# Altium schematic symbol library Regulator_Linear.SchLib: 1452 symbols (part 4 of 10)
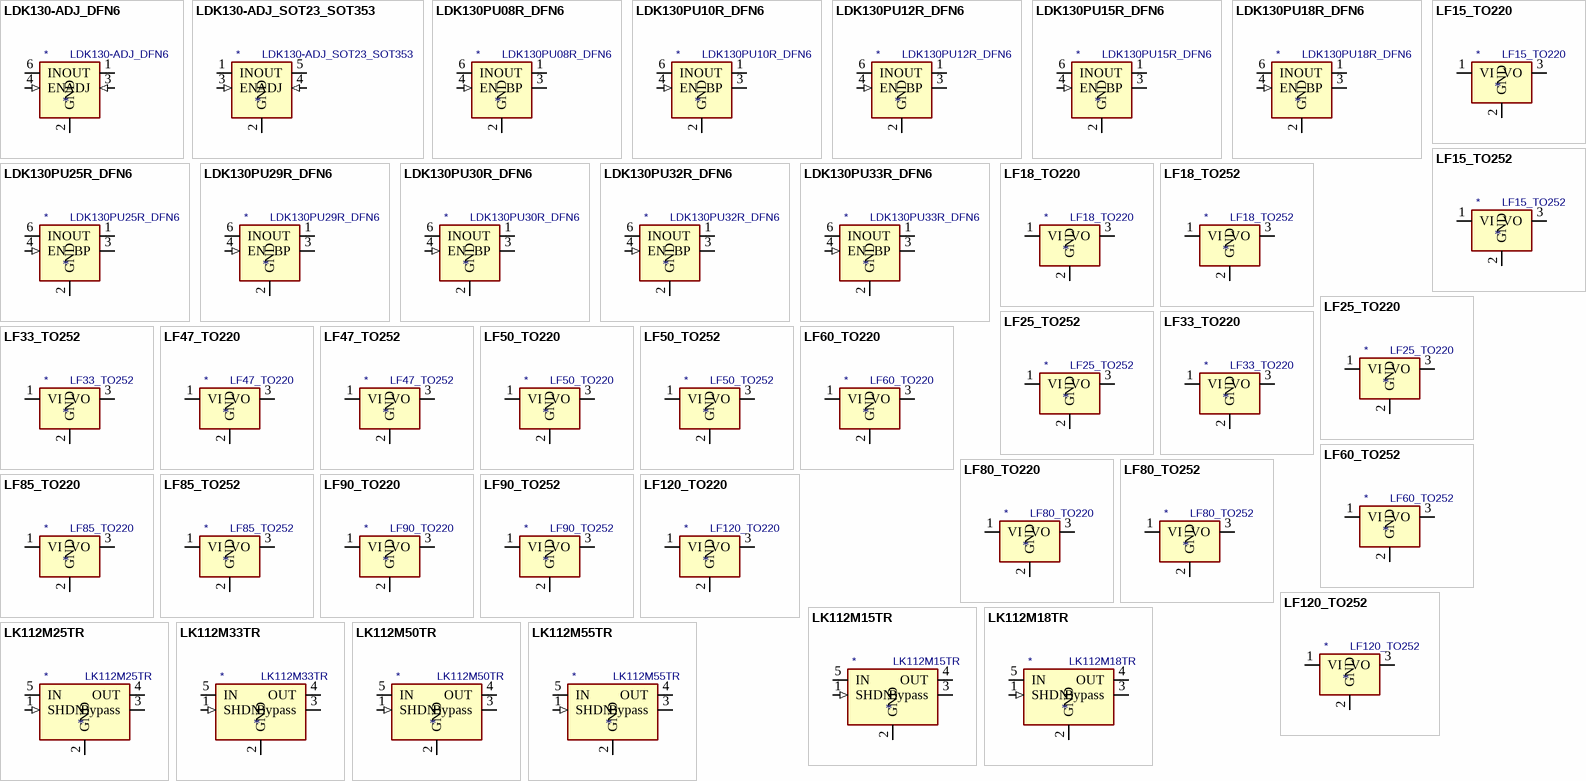
[diagram p39: symbols LDK130-ADJ_DFN6 to LK112M55TR]

## LF85_TO220
designator *  value LF85_TO220
ki_keywords: LDO regulator voltage; ki_description: Low-drop Voltage Regulator, Io up to 500mA, Fixed Vo 8.5V, TO-220; ki_fp_filters: TO?220*; Footprint: Package_TO_SOT_THT:TO-220-3_Vertical; Supplier: http://www.st.com/content/ccc/resource/technical/document/datasheet/c4/0e/7e/2a/be/bc/4c/bd/CD00000546.pdf/files/CD00000546.pdf/jcr:content/translations/en.CD00000546.pdf
footprint TO-220-3_Vertical
pins: 1 VI (power), 2 GND (power), 3 VO (power)

## LF85_TO252
designator *  value LF85_TO252
ki_keywords: LDO regulator voltage; ki_description: Low-drop Voltage Regulator, Io up to 500mA, Fixed Vo 8.5V, TO-252 (DPAK); ki_fp_filters: TO?252*; Footprint: Package_TO_SOT_SMD:TO-252-2; Supplier: http://www.st.com/content/ccc/resource/technical/document/datasheet/c4/0e/7e/2a/be/bc/4c/bd/CD00000546.pdf/files/CD00000546.pdf/jcr:content/translations/en.CD00000546.pdf
footprint TO-252-2
pins: 1 VI (power), 2 GND (power), 3 VO (power)

## LF90_TO220
designator *  value LF90_TO220
ki_keywords: LDO regulator voltage; ki_description: Low-drop Voltage Regulator, Io up to 500mA, Fixed Vo 9.0V, TO-220; ki_fp_filters: TO?220*; Footprint: Package_TO_SOT_THT:TO-220-3_Vertical; Supplier: http://www.st.com/content/ccc/resource/technical/document/datasheet/c4/0e/7e/2a/be/bc/4c/bd/CD00000546.pdf/files/CD00000546.pdf/jcr:content/translations/en.CD00000546.pdf
footprint TO-220-3_Vertical
pins: 1 VI (power), 2 GND (power), 3 VO (power)

## LF90_TO252
designator *  value LF90_TO252
ki_keywords: LDO regulator voltage; ki_description: Low-drop Voltage Regulator, Io up to 500mA, Fixed Vo 9.0V, TO-252 (DPAK); ki_fp_filters: TO?252*; Footprint: Package_TO_SOT_SMD:TO-252-2; Supplier: http://www.st.com/content/ccc/resource/technical/document/datasheet/c4/0e/7e/2a/be/bc/4c/bd/CD00000546.pdf/files/CD00000546.pdf/jcr:content/translations/en.CD00000546.pdf
footprint TO-252-2
pins: 1 VI (power), 2 GND (power), 3 VO (power)

## LF120_TO220
designator *  value LF120_TO220
ki_keywords: LDO regulator voltage; ki_description: Low-drop Voltage Regulator, Io up to 500mA, Fixed Vo 12.0V, TO-220; ki_fp_filters: TO?220*; Footprint: Package_TO_SOT_THT:TO-220-3_Vertical; Supplier: http://www.st.com/content/ccc/resource/technical/document/datasheet/c4/0e/7e/2a/be/bc/4c/bd/CD00000546.pdf/files/CD00000546.pdf/jcr:content/translations/en.CD00000546.pdf
footprint TO-220-3_Vertical
pins: 1 VI (power), 2 GND (power), 3 VO (power)

## LF120_TO252
designator *  value LF120_TO252
ki_keywords: LDO regulator voltage; ki_description: Low-drop Voltage Regulator, Io up to 500mA, Fixed Vo 12.0V, TO-252 (DPAK); ki_fp_filters: TO?252*; Footprint: Package_TO_SOT_SMD:TO-252-2; Supplier: http://www.st.com/content/ccc/resource/technical/document/datasheet/c4/0e/7e/2a/be/bc/4c/bd/CD00000546.pdf/files/CD00000546.pdf/jcr:content/translations/en.CD00000546.pdf
footprint TO-252-2
pins: 1 VI (power), 2 GND (power), 3 VO (power)

## LK112M15TR
designator *  value LK112M15TR
ki_keywords: LDO regulator voltage; ki_description: Low noise and low drop voltage regulator with shutdown function, 150mA, Vout = 1.5V, SOT-23-5; ki_fp_filters: SOT?23*; Footprint: Package_TO_SOT_SMD:SOT-23-5; Supplier: https://www.st.com/resource/ja/datasheet/lk112.pdf
footprint SOT-23-5
pins: 1 SHDN (in), 2 GND (power), 3 Bypass, 4 OUT (power), 5 IN (power)

## LK112M18TR
designator *  value LK112M18TR
ki_keywords: LDO regulator voltage; ki_description: Low noise and low drop voltage regulator with shutdown function, 150mA, Vout = 1.8V, SOT-23-5; ki_fp_filters: SOT?23*; Footprint: Package_TO_SOT_SMD:SOT-23-5; Supplier: https://www.st.com/resource/ja/datasheet/lk112.pdf
footprint SOT-23-5
pins: 1 SHDN (in), 2 GND (power), 3 Bypass, 4 OUT (power), 5 IN (power)

## LK112M25TR
designator *  value LK112M25TR
ki_keywords: LDO regulator voltage; ki_description: Low noise and low drop voltage regulator with shutdown function, 150mA, Vout = 2.5V, SOT-23-5; ki_fp_filters: SOT?23*; Footprint: Package_TO_SOT_SMD:SOT-23-5; Supplier: https://www.st.com/resource/ja/datasheet/lk112.pdf
footprint SOT-23-5
pins: 1 SHDN (in), 2 GND (power), 3 Bypass, 4 OUT (power), 5 IN (power)

## LK112M33TR
designator *  value LK112M33TR
ki_keywords: LDO regulator voltage; ki_description: Low noise and low drop voltage regulator with shutdown function, 150mA, Vout = 3.3V, SOT-23-5; ki_fp_filters: SOT?23*; Footprint: Package_TO_SOT_SMD:SOT-23-5; Supplier: https://www.st.com/resource/ja/datasheet/lk112.pdf
footprint SOT-23-5
pins: 1 SHDN (in), 2 GND (power), 3 Bypass, 4 OUT (power), 5 IN (power)

## LK112M50TR
designator *  value LK112M50TR
ki_keywords: LDO regulator voltage; ki_description: Low noise and low drop voltage regulator with shutdown function, 150mA, Vout = 5.0V, SOT-23-5; ki_fp_filters: SOT?23*; Footprint: Package_TO_SOT_SMD:SOT-23-5; Supplier: https://www.st.com/resource/ja/datasheet/lk112.pdf
footprint SOT-23-5
pins: 1 SHDN (in), 2 GND (power), 3 Bypass, 4 OUT (power), 5 IN (power)

## LK112M55TR
designator *  value LK112M55TR
ki_keywords: LDO regulator voltage; ki_description: Low noise and low drop voltage regulator with shutdown function, 150mA, Vout = 5.5V, SOT-23-5; ki_fp_filters: SOT?23*; Footprint: Package_TO_SOT_SMD:SOT-23-5; Supplier: https://www.st.com/resource/ja/datasheet/lk112.pdf
footprint SOT-23-5
pins: 1 SHDN (in), 2 GND (power), 3 Bypass, 4 OUT (power), 5 IN (power)

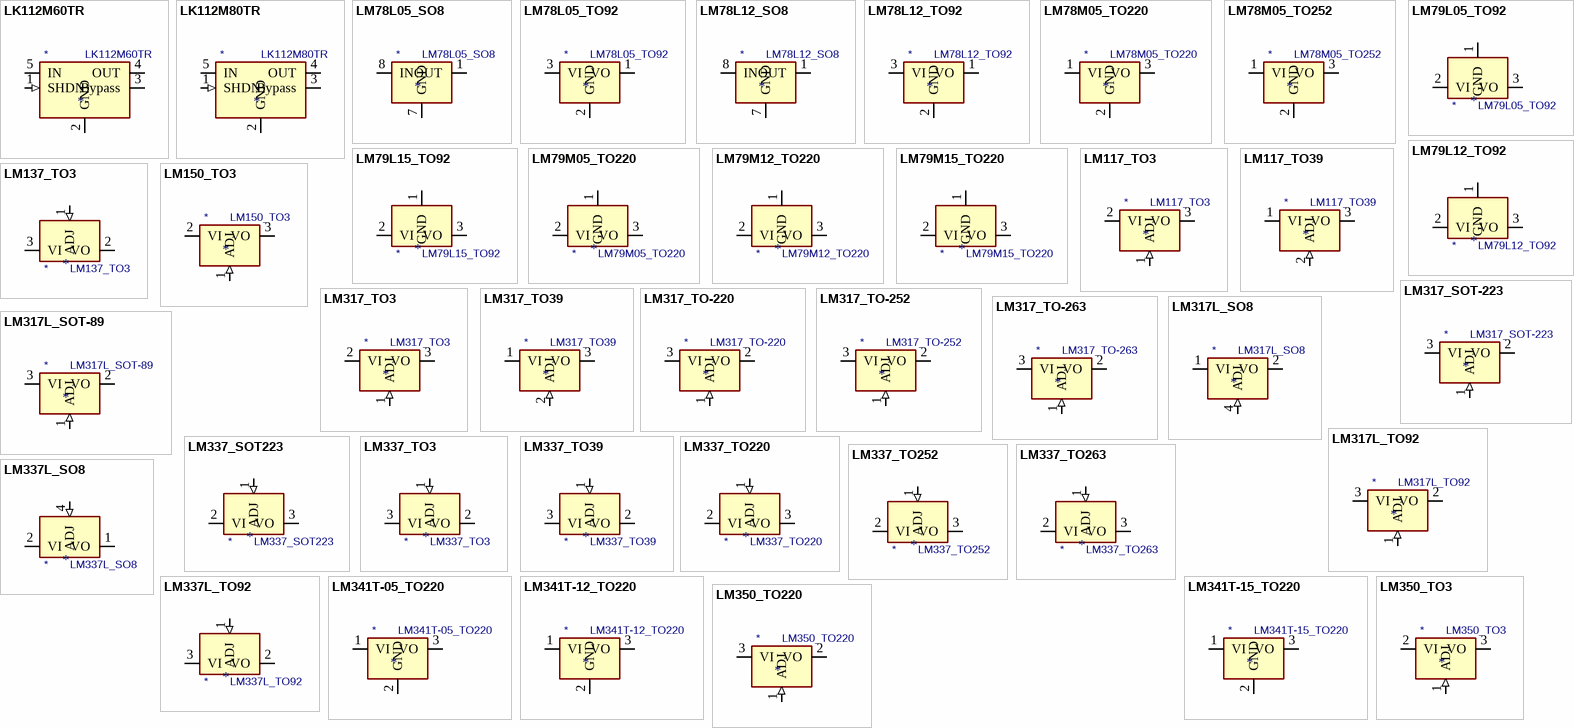
[diagram p12: symbols LK112M60TR to LM350_TO220]

## LK112M60TR
designator *  value LK112M60TR
ki_keywords: LDO regulator voltage; ki_description: Low noise and low drop voltage regulator with shutdown function, 150mA, Vout = 6.0V, SOT-23-5; ki_fp_filters: SOT?23*; Footprint: Package_TO_SOT_SMD:SOT-23-5; Supplier: https://www.st.com/resource/ja/datasheet/lk112.pdf
footprint SOT-23-5
pins: 1 SHDN (in), 2 GND (power), 3 Bypass, 4 OUT (power), 5 IN (power)

## LK112M80TR
designator *  value LK112M80TR
ki_keywords: LDO regulator voltage; ki_description: Low noise and low drop voltage regulator with shutdown function, 150mA, Vout = 8.0V, SOT-23-5; ki_fp_filters: SOT?23*; Footprint: Package_TO_SOT_SMD:SOT-23-5; Supplier: https://www.st.com/resource/ja/datasheet/lk112.pdf
footprint SOT-23-5
pins: 1 SHDN (in), 2 GND (power), 3 Bypass, 4 OUT (power), 5 IN (power)

## LM78L05_SO8
designator *  value LM78L05_SO8
ki_keywords: Voltage Regulator 100mA Positive; ki_description: Positive 100mA 30V Linear Regulator, Fixed Output 5V, SO-8; ki_fp_filters: SOIC*3.9x4.9mm*P1.27mm*; Footprint: Package_SO:SOIC-8_3.9x4.9mm_P1.27mm; Supplier: https://www.onsemi.com/pub/Collateral/MC78L06A-D.pdf
footprint SOIC-8_3.9x4.9mm_P1.27mm
pins: 1 OUT (power), 2 GND hidden, 3 GND hidden, 4 NC (in) hidden, 5 NC (in) hidden, 6 GND hidden, 7 GND (power), 8 IN (power)

## LM78L05_TO92
designator *  value LM78L05_TO92
ki_keywords: Voltage Regulator 100mA Positive; ki_description: Positive 100mA 30V Linear Regulator, Fixed Output 5V, TO-92; ki_fp_filters: TO?92*; Footprint: Package_TO_SOT_THT:TO-92_Inline; Supplier: https://www.onsemi.com/pub/Collateral/MC78L06A-D.pdf
footprint TO-92_Inline
pins: 1 VO (power), 2 GND (power), 3 VI (power)

## LM78L12_SO8
designator *  value LM78L12_SO8
ki_keywords: Voltage Regulator 100mA Positive; ki_description: Positive 100mA 30V Linear Regulator, Fixed Output 12V, SO-8; ki_fp_filters: SOIC*3.9x4.9mm*P1.27mm*; Footprint: Package_SO:SOIC-8_3.9x4.9mm_P1.27mm; Supplier: https://www.onsemi.com/pub/Collateral/MC78L06A-D.pdf
footprint SOIC-8_3.9x4.9mm_P1.27mm
pins: 1 OUT (power), 2 GND hidden, 3 GND hidden, 4 NC (in) hidden, 5 NC (in) hidden, 6 GND hidden, 7 GND (power), 8 IN (power)

## LM78L12_TO92
designator *  value LM78L12_TO92
ki_keywords: Voltage Regulator 100mA Positive; ki_description: Positive 100mA 30V Linear Regulator, Fixed Output 12V, TO-92; ki_fp_filters: TO?92*; Footprint: Package_TO_SOT_THT:TO-92_Inline; Supplier: https://www.onsemi.com/pub/Collateral/MC78L06A-D.pdf
footprint TO-92_Inline
pins: 1 VO (power), 2 GND (power), 3 VI (power)

## LM78M05_TO220
designator *  value LM78M05_TO220
ki_keywords: Voltage Regulator 500mA Positive; ki_description: Positive 500mA 35V Linear Regulator, Fixed Output 5V, TO-220; ki_fp_filters: TO?220*; Footprint: Package_TO_SOT_THT:TO-220-3_Vertical; Supplier: https://www.onsemi.com/pub/Collateral/MC78M00-D.PDF
footprint TO-220-3_Vertical
pins: 1 VI (power), 2 GND (power), 3 VO (power)

## LM78M05_TO252
designator *  value LM78M05_TO252
ki_keywords: Voltage Regulator 500mA Positive; ki_description: Positive 500mA 35V Linear Regulator, Fixed Output 5V, TO-252 (D-PAK); ki_fp_filters: TO?252*; Footprint: Package_TO_SOT_SMD:TO-252-2; Supplier: https://www.onsemi.com/pub/Collateral/MC78M00-D.PDF
footprint TO-252-2
pins: 1 VI (power), 2 GND (power), 3 VO (power)

## LM79L05_TO92
designator *  value LM79L05_TO92
ki_keywords: negative regulatpr; ki_description: 3-Terminal Negative Regulator, -5V, TO-92; ki_fp_filters: TO?92*; Footprint: Package_TO_SOT_THT:TO-92_Inline; Supplier: http://www.ti.com/lit/ds/symlink/lm79l.pdf
footprint TO-92_Inline
pins: 1 GND (power), 2 VI (power), 3 VO (power)

## LM79L12_TO92
designator *  value LM79L12_TO92
ki_keywords: negative regulatpr; ki_description: 3-Terminal Negative Regulator, -12V, TO-92; ki_fp_filters: TO?92*; Footprint: Package_TO_SOT_THT:TO-92_Inline; Supplier: http://www.ti.com/lit/ds/symlink/lm79l.pdf
footprint TO-92_Inline
pins: 1 GND (power), 2 VI (power), 3 VO (power)

## LM79L15_TO92
designator *  value LM79L15_TO92
ki_keywords: negative regulatpr; ki_description: 3-Terminal Negative Regulator, -15V, TO-92; ki_fp_filters: TO?92*; Footprint: Package_TO_SOT_THT:TO-92_Inline; Supplier: http://www.ti.com/lit/ds/symlink/lm79l.pdf
footprint TO-92_Inline
pins: 1 GND (power), 2 VI (power), 3 VO (power)

## LM79M05_TO220
designator *  value LM79M05_TO220
ki_keywords: Voltage Regulator 500mA Negative; ki_description: Negative 500mA 35V Linear Regulator, Fixed Output 5V, TO-220; ki_fp_filters: TO?220*; Footprint: Package_TO_SOT_THT:TO-220-3_Vertical; Supplier: https://www.onsemi.com/pub/Collateral/MC79M00-D.PDF
footprint TO-220-3_Vertical
pins: 1 GND (power), 2 VI (power), 3 VO (power)

## LM79M12_TO220
designator *  value LM79M12_TO220
ki_keywords: Voltage Regulator 500mA Negative; ki_description: Negative 500mA 35V Linear Regulator, Fixed Output 12V, TO-220; ki_fp_filters: TO?220*; Footprint: Package_TO_SOT_THT:TO-220-3_Vertical; Supplier: https://www.onsemi.com/pub/Collateral/MC79M00-D.PDF
footprint TO-220-3_Vertical
pins: 1 GND (power), 2 VI (power), 3 VO (power)

## LM79M15_TO220
designator *  value LM79M15_TO220
ki_keywords: Voltage Regulator 500mA Negative; ki_description: Negative 500mA 35V Linear Regulator, Fixed Output 15V, TO-220; ki_fp_filters: TO?220*; Footprint: Package_TO_SOT_THT:TO-220-3_Vertical; Supplier: https://www.onsemi.com/pub/Collateral/MC79M00-D.PDF
footprint TO-220-3_Vertical
pins: 1 GND (power), 2 VI (power), 3 VO (power)

## LM117_TO3
designator *  value LM117_TO3
ki_keywords: Adjustable Voltage Regulator 1,5A Positive; ki_description: 1,5A 35V Adjustable Linear Regulator, TO-3; ki_fp_filters: TO?3*; Footprint: Package_TO_SOT_THT:TO-3; Supplier: http://www.ti.com/lit/ds/symlink/lm317.pdf
footprint TO-3
pins: 1 ADJ (in), 2 VI (power), 3 VO (power)

## LM117_TO39
designator *  value LM117_TO39
ki_keywords: Adjustable Voltage Regulator 500mA Positive; ki_description: 500mA 35V Adjustable Linear Regulator, TO-39; ki_fp_filters: TO?39*; Footprint: Package_TO_SOT_THT:TO-39-3; Supplier: http://www.ti.com/lit/ds/symlink/lm317.pdf
footprint TO-39-3
pins: 1 VI (power), 2 ADJ (in), 3 VO (power)

## LM137_TO3
designator *  value LM137_TO3
ki_keywords: Adjustable Voltage Regulator 1.5A Negative; ki_description: Negative 1.5A 35V Adjustable Linear Regulator, TO-3; ki_fp_filters: TO?3*; Footprint: Package_TO_SOT_THT:TO-3; Supplier: http://www.ti.com/lit/ds/symlink/lm337-n.pdf
footprint TO-3
pins: 1 ADJ (in), 2 VO (power), 3 VI (power)

## LM150_TO3
designator *  value LM150_TO3
ki_keywords: Adjustable Voltage Regulator 3A Positive; ki_description: 3A 33V Adjustable Linear Regulator, TO-3; ki_fp_filters: TO?3*; Footprint: Package_TO_SOT_THT:TO-3; Supplier: http://www.ti.com/lit/ds/symlink/lm350a.pdf
footprint TO-3
pins: 1 ADJ (in), 2 VI (power), 3 VO (power)

## LM317_SOT-223
designator *  value LM317_SOT-223
ki_keywords: Adjustable Voltage Regulator 1A Positive; ki_description: 1.5A 35V Adjustable Linear Regulator, SOT-223; ki_fp_filters: SOT?223*TabPin2*; Footprint: Package_TO_SOT_SMD:SOT-223-3_TabPin2; Supplier: http://www.ti.com/lit/ds/symlink/lm317.pdf
footprint SOT-223-3_TabPin2
pins: 1 ADJ (in), 2 VO (power), 3 VI (power)

## LM317_TO3
designator *  value LM317_TO3
ki_keywords: Adjustable Voltage Regulator 1.5A Positive; ki_description: 1.5A 35V Adjustable Linear Regulator, TO-3; ki_fp_filters: TO?3*; Footprint: Package_TO_SOT_THT:TO-3; Supplier: http://www.ti.com/lit/ds/symlink/lm317.pdf
footprint TO-3
pins: 1 ADJ (in), 2 VI (power), 3 VO (power)

## LM317_TO39
designator *  value LM317_TO39
ki_keywords: Adjustable Voltage Regulator 500mA Positive; ki_description: 500mA 35V Adjustable Linear Regulator, TO-39; ki_fp_filters: TO?39*; Footprint: Package_TO_SOT_THT:TO-39-3; Supplier: http://www.ti.com/lit/ds/symlink/lm317.pdf
footprint TO-39-3
pins: 1 VI (power), 2 ADJ (in), 3 VO (power)

## LM317_TO-220
designator *  value LM317_TO-220
ki_keywords: Adjustable Voltage Regulator 1A Positive; ki_description: 1.5A 35V Adjustable Linear Regulator, TO-220; ki_fp_filters: TO?220*; Footprint: Package_TO_SOT_THT:TO-220-3_Vertical; Supplier: http://www.ti.com/lit/ds/symlink/lm317.pdf
footprint TO-220-3_Vertical
pins: 1 ADJ (in), 2 VO (power), 3 VI (power)

## LM317_TO-252
designator *  value LM317_TO-252
ki_keywords: Adjustable Voltage Regulator 1A Positive; ki_description: 1.5A 35V Adjustable Linear Regulator, TO-252; ki_fp_filters: TO?252*; Footprint: Package_TO_SOT_SMD:TO-252-2; Supplier: http://www.ti.com/lit/ds/snvs774n/snvs774n.pdf
footprint TO-252-2
pins: 1 ADJ (in), 2 VO (power), 3 VI (power)

## LM317_TO-263
designator *  value LM317_TO-263
ki_keywords: Adjustable Voltage Regulator 1A Positive; ki_description: 1.5A 35V Adjustable Linear Regulator, TO-263; ki_fp_filters: TO?263*; Footprint: Package_TO_SOT_SMD:TO-263-2; Supplier: http://www.ti.com/lit/ds/symlink/lm317.pdf
footprint TO-263-2
pins: 1 ADJ (in), 2 VO (power), 3 VI (power)

## LM317L_SO8
designator *  value LM317L_SO8
ki_keywords: Adjustable Voltage Regulator 100mA Positive; ki_description: 100mA 35V Adjustable Linear Regulator, SO-8; ki_fp_filters: SOIC*3.9x4.9mm*P1.27mm*; Footprint: Package_SO:SOIC-8_3.9x4.9mm_P1.27mm; Supplier: http://www.ti.com/lit/ds/snvs775k/snvs775k.pdf
footprint SOIC-8_3.9x4.9mm_P1.27mm
pins: 1 VI (power), 2 VO (power), 3 VO hidden, 4 ADJ (in), 5 NC (in) hidden, 6 VO hidden, 7 VO hidden, 8 NC (in) hidden

## LM317L_SOT-89
designator *  value LM317L_SOT-89
ki_keywords: Adjustable Voltage Regulator 1A Positive; ki_description: 100mA 35V Adjustable Linear Regulator, SOT-89; ki_fp_filters: SOT?89*; Footprint: Package_TO_SOT_SMD:SOT-89-3; Supplier: http://www.ti.com/lit/ds/symlink/lm317l.pdf
footprint SOT-89-3
pins: 1 ADJ (in), 2 VO (power), 3 VI (power)

## LM317L_TO92
designator *  value LM317L_TO92
ki_keywords: Adjustable Voltage Regulator 100mA Positive; ki_description: 100mA 35V Adjustable Linear Regulator, TO-92; ki_fp_filters: TO?92*; Footprint: Package_TO_SOT_THT:TO-92_Inline; Supplier: http://www.ti.com/lit/ds/snvs775k/snvs775k.pdf
footprint TO-92_Inline
pins: 1 ADJ (in), 2 VO (power), 3 VI (power)

## LM337_SOT223
designator *  value LM337_SOT223
ki_keywords: Adjustable Voltage Regulator 1A Negative; ki_description: Negative 1A 35V Adjustable Linear Regulator, SOT-223; ki_fp_filters: SOT?223*; Footprint: Package_TO_SOT_SMD:SOT-223-3_TabPin2; Supplier: http://www.ti.com/lit/ds/symlink/lm337-n.pdf
footprint SOT-223-3_TabPin2
pins: 1 ADJ (in), 2 VI (power), 3 VO (power)

## LM337_TO3
designator *  value LM337_TO3
ki_keywords: Adjustable Voltage Regulator 1.5A Negative; ki_description: Negative 1.5A 35V Adjustable Linear Regulator, TO-3; ki_fp_filters: TO?3*; Footprint: Package_TO_SOT_THT:TO-3; Supplier: http://www.ti.com/lit/ds/symlink/lm337-n.pdf
footprint TO-3
pins: 1 ADJ (in), 2 VO (power), 3 VI (power)

## LM337_TO39
designator *  value LM337_TO39
ki_keywords: Adjustable Voltage Regulator 500mA Negative; ki_description: Negative 500mA 35V Adjustable Linear Regulator, TO-39; ki_fp_filters: TO?39*; Footprint: Package_TO_SOT_THT:TO-39-3; Supplier: http://www.ti.com/lit/ds/symlink/lm337-n.pdf
footprint TO-39-3
pins: 1 ADJ (in), 2 VO (power), 3 VI (power)

## LM337_TO220
designator *  value LM337_TO220
ki_keywords: Adjustable Voltage Regulator 1.5A Negative; ki_description: Negative 1.5A 35V Adjustable Linear Regulator, TO-220; ki_fp_filters: TO?220*; Footprint: Package_TO_SOT_THT:TO-220-3_Vertical; Supplier: http://www.ti.com/lit/ds/symlink/lm337-n.pdf
footprint TO-220-3_Vertical
pins: 1 ADJ (in), 2 VI (power), 3 VO (power)

## LM337_TO252
designator *  value LM337_TO252
ki_keywords: Adjustable Voltage Regulator 1A Negative; ki_description: Negative 1A 35V Adjustable Linear Regulator, TO-252(DPAK); ki_fp_filters: TO?252*; Footprint: Package_TO_SOT_SMD:TO-252-2; Supplier: http://www.farnell.com/datasheets/1636957.pdf
footprint TO-252-2
pins: 1 ADJ (in), 2 VI (power), 3 VO (power)

## LM337_TO263
designator *  value LM337_TO263
ki_keywords: Adjustable Voltage Regulator 1A Negative; ki_description: Negative 1A 35V Adjustable Linear Regulator, TO-263(D2-PAK); ki_fp_filters: TO?263*; Footprint: Package_TO_SOT_SMD:TO-263-2; Supplier: https://www.onsemi.com/pub/Collateral/LM337-D.PDF
footprint TO-263-2
pins: 1 ADJ (in), 2 VI (power), 3 VO (power)

## LM337L_SO8
designator *  value LM337L_SO8
ki_keywords: Adjustable Negative Voltage Regulator 100mA; ki_description: 100mA 35V Adjustable Negative Linear Regulator, SO-8; ki_fp_filters: SOIC*3.9x4.9mm*P1.27mm*; Footprint: Package_SO:SOIC-8_3.9x4.9mm_P1.27mm; Supplier: http://www.ti.com/lit/ds/symlink/lm337l.pdf
footprint SOIC-8_3.9x4.9mm_P1.27mm
pins: 1 VO (power), 2 VI (power), 3 VI hidden, 4 ADJ (in), 5 NC (in) hidden, 6 VI hidden, 7 VI hidden, 8 NC (in) hidden

## LM337L_TO92
designator *  value LM337L_TO92
ki_keywords: Adjustable Voltage Regulator 100mA Negative; ki_description: Negative 100mA 35V Adjustable Linear Regulator, TO-92; ki_fp_filters: TO?92*; Footprint: Package_TO_SOT_THT:TO-92_Inline; Supplier: http://www.ti.com/lit/ds/symlink/lm337l.pdf
footprint TO-92_Inline
pins: 1 ADJ (in), 2 VO (power), 3 VI (power)

## LM341T-05_TO220
designator *  value LM341T-05_TO220
ki_keywords: Voltage Regulator 500mA Positive; ki_description: Positive 500mA 35V Linear Regulator, Fixed Output 5V, TO-220; ki_fp_filters: TO?220*; Footprint: Package_TO_SOT_THT:TO-220-3_Vertical; Supplier: https://www.ti.com/lit/ds/symlink/lm341.pdf
footprint TO-220-3_Vertical
pins: 1 VI (power), 2 GND (power), 3 VO (power)

## LM341T-12_TO220
designator *  value LM341T-12_TO220
ki_keywords: Voltage Regulator 500mA Positive; ki_description: Positive 500mA 35V Linear Regulator, Fixed Output 12V, TO-220; ki_fp_filters: TO?220*; Footprint: Package_TO_SOT_THT:TO-220-3_Vertical; Supplier: https://www.ti.com/lit/ds/symlink/lm341.pdf
footprint TO-220-3_Vertical
pins: 1 VI (power), 2 GND (power), 3 VO (power)

## LM341T-15_TO220
designator *  value LM341T-15_TO220
ki_keywords: Voltage Regulator 500mA Positive; ki_description: Positive 500mA 35V Linear Regulator, Fixed Output 15V, TO-220; ki_fp_filters: TO?220*; Footprint: Package_TO_SOT_THT:TO-220-3_Vertical; Supplier: https://www.ti.com/lit/ds/symlink/lm341.pdf
footprint TO-220-3_Vertical
pins: 1 VI (power), 2 GND (power), 3 VO (power)

## LM350_TO3
designator *  value LM350_TO3
ki_keywords: Adjustable Voltage Regulator 3A Positive; ki_description: 3A 33V Adjustable Linear Regulator, TO-3; ki_fp_filters: TO?3*; Footprint: Package_TO_SOT_THT:TO-3; Supplier: http://www.ti.com/lit/ds/symlink/lm350a.pdf
footprint TO-3
pins: 1 ADJ (in), 2 VI (power), 3 VO (power)

## LM350_TO220
designator *  value LM350_TO220
ki_keywords: Adjustable Voltage Regulator 3A Positive; ki_description: 3A 33V Adjustable Linear Regulator, TO-220; ki_fp_filters: TO?220*; Footprint: Package_TO_SOT_THT:TO-220-3_Vertical; Supplier: https://www.onsemi.com/pub/Collateral/LM350-D.pdf
footprint TO-220-3_Vertical
pins: 1 ADJ (in), 2 VO (power), 3 VI (power)

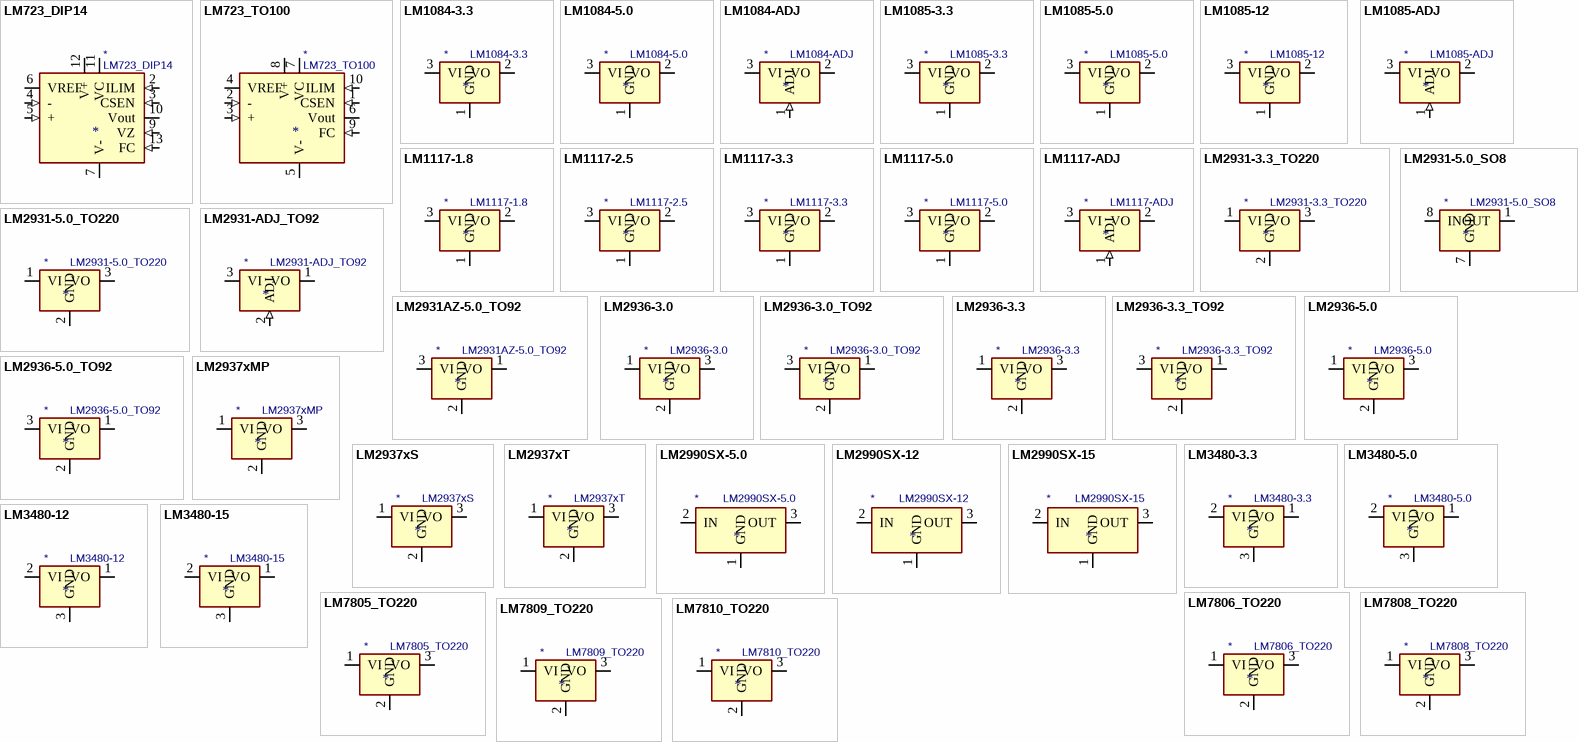
[diagram p13: symbols LM723_DIP14 to LM7810_TO220]

## LM723_DIP14
designator *  value LM723_DIP14
ki_keywords: POWER REGUL; ki_description: Linear Regulator (adjustable), DIP-14; ki_fp_filters: DIP*W7.62mm*; Footprint: Package_DIP:DIP-14_W7.62mm; Supplier: http://www.ti.com/lit/ds/symlink/lm723.pdf
footprint DIP-14_W7.62mm
pins: 1 NC (in) hidden, 2 ILIM (in), 3 CSEN (in), 4 - (in), 5 + (in), 6 VREF (power), 7 V- (power), 8 NC (in) hidden, 9 VZ (in), 10 Vout (power), 11 VC (power), 12 V+ (power), 13 FC (in), 14 NC (in) hidden

## LM723_TO100
designator *  value LM723_TO100
ki_keywords: POWER REGUL; ki_description: Linear Regulator (adjustable), TO-100; ki_fp_filters: TO?100*; Footprint: Package_TO_SOT_THT:TO-100-10; Supplier: http://www.ti.com/lit/ds/symlink/lm723.pdf
footprint TO-100-10
pins: 1 CSEN (in), 2 - (in), 3 + (in), 4 VREF (power), 5 V- (power), 6 Vout (power), 7 VC (power), 8 V+ (power), 9 FC (in), 10 ILIM (in)

## LM1084-3.3
designator *  value LM1084-3.3
ki_keywords: Voltage Regulator Fixed 5A Positive; ki_description: 5A 27V Linear Regulator, Fixed Output 3.3V, TO-220/TO-263; ki_fp_filters: TO?220* TO?263*; Supplier: http://www.ti.com/lit/ds/symlink/lm1084.pdf
pins: 1 GND (power), 2 VO (power), 3 VI (power)

## LM1084-5.0
designator *  value LM1084-5.0
ki_keywords: Voltage Regulator 5A Positive; ki_description: 5A 27V Linear Regulator, Fixed Output 5.0V, TO-220/TO-263; ki_fp_filters: TO?220* TO?263*; Supplier: http://www.ti.com/lit/ds/symlink/lm1084.pdf
pins: 1 GND (power), 2 VO (power), 3 VI (power)

## LM1084-ADJ
designator *  value LM1084-ADJ
ki_keywords: Adjustable Voltage Regulator 5A Positive; ki_description: 5A 29V Adjustable Linear Regulator, TO-220 / TO-263 (D2-PAK); ki_fp_filters: TO?220* TO?263*; Supplier: http://www.ti.com/lit/ds/symlink/lm1084.pdf
pins: 1 ADJ (in), 2 VO (power), 3 VI (power)

## LM1085-3.3
designator *  value LM1085-3.3
ki_keywords: Voltage Regulator Fixed 5A Positive; ki_description: 3A 27V Linear Regulator, Fixed Output 3.3V, TO-220/TO-263; ki_fp_filters: TO?220* TO?263*; Supplier: http://www.ti.com/lit/ds/symlink/lm1085.pdf
pins: 1 GND (power), 2 VO (power), 3 VI (power)

## LM1085-5.0
designator *  value LM1085-5.0
ki_keywords: Voltage Regulator 5A Positive; ki_description: 3A 25V Linear Regulator, Fixed Output 5.0V, TO-220/TO-263; ki_fp_filters: TO?220* TO?263*; Supplier: http://www.ti.com/lit/ds/symlink/lm1085.pdf
pins: 1 GND (power), 2 VO (power), 3 VI (power)

## LM1085-12
designator *  value LM1085-12
ki_keywords: Voltage Regulator 5A Positive; ki_description: 3A 18V Linear Regulator, Fixed Output 12.0V, TO-220/TO-263; ki_fp_filters: TO?220* TO?263*; Supplier: http://www.ti.com/lit/ds/symlink/lm1085.pdf
pins: 1 GND (power), 2 VO (power), 3 VI (power)

## LM1085-ADJ
designator *  value LM1085-ADJ
ki_keywords: Adjustable Voltage Regulator 5A Positive; ki_description: 3A 29V Adjustable Linear Regulator, TO-220 / TO-263 (D2-PAK); ki_fp_filters: TO?220* TO?263*; Supplier: http://www.ti.com/lit/ds/symlink/lm1085.pdf
pins: 1 ADJ (in), 2 VO (power), 3 VI (power)

## LM1117-1.8
designator *  value LM1117-1.8
ki_keywords: linear regulator ldo fixed positive; ki_description: 800mA Low-Dropout Linear Regulator, 1.8V fixed output, TO-220/TO-252/TO-263/SOT-223; ki_fp_filters: SOT?223* TO?263* TO?252* TO?220*; Supplier: http://www.ti.com/lit/ds/symlink/lm1117.pdf
pins: 1 GND (power), 2 VO (power), 3 VI (power)

## LM1117-2.5
designator *  value LM1117-2.5
ki_keywords: linear regulator ldo fixed positive; ki_description: 800mA Low-Dropout Linear Regulator, 2.5V fixed output, TO-220/TO-252/TO-263/SOT-223; ki_fp_filters: SOT?223* TO?263* TO?252* TO?220*; Supplier: http://www.ti.com/lit/ds/symlink/lm1117.pdf
pins: 1 GND (power), 2 VO (power), 3 VI (power)

## LM1117-3.3
designator *  value LM1117-3.3
ki_keywords: linear regulator ldo fixed positive; ki_description: 800mA Low-Dropout Linear Regulator, 3.3V fixed output, TO-220/TO-252/TO-263/SOT-223; ki_fp_filters: SOT?223* TO?263* TO?252* TO?220*; Supplier: http://www.ti.com/lit/ds/symlink/lm1117.pdf
pins: 1 GND (power), 2 VO (power), 3 VI (power)

## LM1117-5.0
designator *  value LM1117-5.0
ki_keywords: linear regulator ldo fixed positive; ki_description: 800mA Low-Dropout Linear Regulator, 5.0V fixed output, TO-220/TO-252/TO-263/SOT-223; ki_fp_filters: SOT?223* TO?263* TO?252* TO?220*; Supplier: http://www.ti.com/lit/ds/symlink/lm1117.pdf
pins: 1 GND (power), 2 VO (power), 3 VI (power)

## LM1117-ADJ
designator *  value LM1117-ADJ
ki_keywords: linear regulator ldo adjustable positive; ki_description: 800mA Low-Dropout Linear Regulator, adjustable output, TO-220/TO-252/TO-263/SOT-223; ki_fp_filters: SOT?223* TO?263* TO?252* TO?220*; Supplier: http://www.ti.com/lit/ds/symlink/lm1117.pdf
pins: 1 ADJ (in), 2 VO (power), 3 VI (power)

## LM2931-3.3_TO220
designator *  value LM2931-3.3_TO220
ki_keywords: Low Dropout Voltage Regulator 100mA Positive; ki_description: Positive 100 mA 60V Linear Low Dropout Regulator, Fixed Output 3.3V, TO-220; ki_fp_filters: TO?220*; Footprint: Package_TO_SOT_THT:TO-220-3_Vertical; Supplier: https://www.ti.com/lit/ds/symlink/lm2931-n.pdf
footprint TO-220-3_Vertical
pins: 1 VI (power), 2 GND (power), 3 VO (power)

## LM2931-5.0_SO8
designator *  value LM2931-5.0_SO8
ki_keywords: Voltage Regulator 100mA Positive; ki_description: Positive 100mA 30V Linear Regulator, Fixed Output 5V, SO-8; ki_fp_filters: SOIC*3.9x4.9mm*P1.27mm*; Footprint: Package_SO:SOIC-8_3.9x4.9mm_P1.27mm; Supplier: http://www.ti.com/lit/ds/symlink/lm2931-n.pdf
footprint SOIC-8_3.9x4.9mm_P1.27mm
pins: 1 OUT (power), 2 GND hidden, 3 GND hidden, 4 NC (in) hidden, 5 NC (in) hidden, 6 GND hidden, 7 GND (power), 8 IN (power)

## LM2931-5.0_TO220
designator *  value LM2931-5.0_TO220
ki_keywords: Low Dropout Voltage Regulator 100mA Positive; ki_description: Positive 100 mA 60V Linear Low Dropout Regulator, Fixed Output 5V, TO-220; ki_fp_filters: TO?220*; Footprint: Package_TO_SOT_THT:TO-220-3_Vertical; Supplier: https://www.ti.com/lit/ds/symlink/lm2931-n.pdf
footprint TO-220-3_Vertical
pins: 1 VI (power), 2 GND (power), 3 VO (power)

## LM2931-ADJ_TO92
designator *  value LM2931-ADJ_TO92
ki_keywords: REGULATOR LDO Adjustable; ki_description: 100mA Low drop-out regulator, Adjustable Output, TO-92; ki_fp_filters: TO?92*; Footprint: Package_TO_SOT_THT:TO-92_Inline; Supplier: http://www.ti.com/lit/ds/symlink/lm2931-n.pdf
footprint TO-92_Inline
pins: 1 VO (power), 2 ADJ (in), 3 VI (power)

## LM2931AZ-5.0_TO92
designator *  value LM2931AZ-5.0_TO92
ki_keywords: REGULATOR LDO 5V; ki_description: 100mA Low drop-out regulator, Fixed Output 5V, TO-92; ki_fp_filters: TO?92*; Footprint: Package_TO_SOT_THT:TO-92_Inline; Supplier: http://www.ti.com/lit/ds/symlink/lm2931-n.pdf
footprint TO-92_Inline
pins: 1 VO (power), 2 GND (power), 3 VI (power)

## LM2936-3.0
designator *  value LM2936-3.0
ki_keywords: linear regulator ldo fixed positive; ki_description: 50mA Ultra-Low Quiescent Current LDO Voltage Regulator, 3.0V fixed output, TO-252/SOT-223; ki_fp_filters: TO?252* SOT?223*; Supplier: http://www.ti.com/lit/ds/symlink/lm2936.pdf
pins: 1 VI (power), 2 GND (power), 3 VO (power)

## LM2936-3.0_TO92
designator *  value LM2936-3.0_TO92
ki_keywords: linear regulator ldo fixed positive; ki_description: 50mA Ultra-Low Quiescent Current LDO Voltage Regulator, 3.0V fixed output, TO-92; ki_fp_filters: TO?92*; Footprint: Package_TO_SOT_THT:TO-92_Inline; Supplier: http://www.ti.com/lit/ds/symlink/lm2936.pdf
footprint TO-92_Inline
pins: 1 VO (power), 2 GND (power), 3 VI (power)

## LM2936-3.3
designator *  value LM2936-3.3
ki_keywords: linear regulator ldo fixed positive; ki_description: 50mA Ultra-Low Quiescent Current LDO Voltage Regulator, 3.3V fixed output, TO-252/SOT-223; ki_fp_filters: TO?252* SOT?223*; Supplier: http://www.ti.com/lit/ds/symlink/lm2936.pdf
pins: 1 VI (power), 2 GND (power), 3 VO (power)

## LM2936-3.3_TO92
designator *  value LM2936-3.3_TO92
ki_keywords: linear regulator ldo fixed positive; ki_description: 50mA Ultra-Low Quiescent Current LDO Voltage Regulator, 3.3V fixed output, TO-92; ki_fp_filters: TO?92*; Footprint: Package_TO_SOT_THT:TO-92_Inline; Supplier: http://www.ti.com/lit/ds/symlink/lm2936.pdf
footprint TO-92_Inline
pins: 1 VO (power), 2 GND (power), 3 VI (power)

## LM2936-5.0
designator *  value LM2936-5.0
ki_keywords: linear regulator ldo fixed positive; ki_description: 50mA Ultra-Low Quiescent Current LDO Voltage Regulator, 5.0V fixed output, TO-252/SOT-223; ki_fp_filters: TO?252* SOT?223*; Supplier: http://www.ti.com/lit/ds/symlink/lm2936.pdf
pins: 1 VI (power), 2 GND (power), 3 VO (power)

## LM2936-5.0_TO92
designator *  value LM2936-5.0_TO92
ki_keywords: linear regulator ldo fixed positive; ki_description: 50mA Ultra-Low Quiescent Current LDO Voltage Regulator, 5.0V fixed output, TO-92; ki_fp_filters: TO?92*; Footprint: Package_TO_SOT_THT:TO-92_Inline; Supplier: http://www.ti.com/lit/ds/symlink/lm2936.pdf
footprint TO-92_Inline
pins: 1 VO (power), 2 GND (power), 3 VI (power)

## LM2937xMP
designator *  value LM2937xMP
ki_keywords: Voltage Regulator Low Dropuout Positive LDO; ki_description: 500-mA Low Dropout Regulator, SOT-223; ki_fp_filters: SOT?223*; Footprint: Package_TO_SOT_SMD:SOT-223-3_TabPin2; Supplier: http://www.ti.com/lit/ds/symlink/lm2937.pdf
footprint SOT-223-3_TabPin2
pins: 1 VI (power), 2 GND (power), 3 VO (power)

## LM2937xS
designator *  value LM2937xS
ki_keywords: Voltage Regulator Low Dropuout Positive LDO; ki_description: 500-mA Low Dropout Regulator, TO-263; ki_fp_filters: TO?263*; Footprint: Package_TO_SOT_SMD:TO-263-3_TabPin2; Supplier: http://www.ti.com/lit/ds/symlink/lm2937.pdf
footprint TO-263-3_TabPin2
pins: 1 VI (power), 2 GND (power), 3 VO (power)

## LM2937xT
designator *  value LM2937xT
ki_keywords: Voltage Regulator Low Dropuout Positive LDO; ki_description: 500-mA Low Dropout Regulator, TO-220; ki_fp_filters: TO?220*; Footprint: Package_TO_SOT_THT:TO-220-3_Vertical; Supplier: http://www.ti.com/lit/ds/symlink/lm2937.pdf
footprint TO-220-3_Vertical
pins: 1 VI (power), 2 GND (power), 3 VO (power)

## LM2990SX-5.0
designator *  value LM2990SX-5.0
ki_keywords: Negative voltage regulator; ki_description: Three termianl low-dropout 1A negative voltage regulator, Input -6V to -26V, Out -5V; ki_fp_filters: TO?263*TabPin2* TO?220*; Supplier: http://www.ti.com/lit/ds/symlink/lm2990.pdf
pins: 1 GND (power), 2 IN (power), 3 OUT (power)

## LM2990SX-12
designator *  value LM2990SX-12
ki_keywords: Negative voltage regulator; ki_description: Three termianl low-dropout 1A negative voltage regulator, Input -6V to -26V, Out -12V; ki_fp_filters: TO?263*TabPin2* TO?220*; Supplier: http://www.ti.com/lit/ds/symlink/lm2990.pdf
pins: 1 GND (power), 2 IN (power), 3 OUT (power)

## LM2990SX-15
designator *  value LM2990SX-15
ki_keywords: Negative voltage regulator; ki_description: Three termianl low-dropout 1A negative voltage regulator, Input -6V to -26V, Out -15V; ki_fp_filters: TO?263*TabPin2* TO?220*; Supplier: http://www.ti.com/lit/ds/symlink/lm2990.pdf
pins: 1 GND (power), 2 IN (power), 3 OUT (power)

## LM3480-3.3
designator *  value LM3480-3.3
ki_keywords: ldo linear fixed positive; ki_description: 100mA, Quasi Low Dropout Voltage Regulator, 3.3V positive fixed output, SOT-23 package; ki_fp_filters: SOT?23*; Footprint: Package_TO_SOT_SMD:SOT-23; Supplier: http://www.ti.com/lit/ds/symlink/lm3480.pdf
footprint SOT-23
pins: 1 VO (power), 2 VI (power), 3 GND (power)

## LM3480-5.0
designator *  value LM3480-5.0
ki_keywords: ldo linear fixed positive; ki_description: 100mA, Quasi Low Dropout Voltage Regulator, 5.0V positive fixed output, SOT-23 package; ki_fp_filters: SOT?23*; Footprint: Package_TO_SOT_SMD:SOT-23; Supplier: http://www.ti.com/lit/ds/symlink/lm3480.pdf
footprint SOT-23
pins: 1 VO (power), 2 VI (power), 3 GND (power)

## LM3480-12
designator *  value LM3480-12
ki_keywords: ldo linear fixed positive; ki_description: 100mA, Quasi Low Dropout Voltage Regulator, 12V positive fixed output, SOT-23 package; ki_fp_filters: SOT?23*; Footprint: Package_TO_SOT_SMD:SOT-23; Supplier: http://www.ti.com/lit/ds/symlink/lm3480.pdf
footprint SOT-23
pins: 1 VO (power), 2 VI (power), 3 GND (power)

## LM3480-15
designator *  value LM3480-15
ki_keywords: ldo linear fixed positive; ki_description: 100mA, Quasi Low Dropout Voltage Regulator, 15V positive fixed output, SOT-23 package; ki_fp_filters: SOT?23*; Footprint: Package_TO_SOT_SMD:SOT-23; Supplier: http://www.ti.com/lit/ds/symlink/lm3480.pdf
footprint SOT-23
pins: 1 VO (power), 2 VI (power), 3 GND (power)
